# Altium footprint library 6-Connectors-4.PcbLib: 166 footprints (part 9 of 12) (continued)
## SAMTEC_SQT-112-01-L-D-RA [mm] "24 Contacts - Pitch 2mm - Dual Row Right Angle Socket" (continued)
  text "1" at 12.3,-1.4 h1.02
  text "24" at -13.7,0.5 h1
3D body "SAMTEC_SQT-112-01-L-D-RA.stp": height 4, standoff -2.29, extent -12.15,-1.25 12.15,8.62
3D body "v160-080.stp": height 0.02, standoff -1.65, extent -11.8,0.2 -10.2,1.8
3D body "v160-080.stp": height 0.02, standoff -1.65, extent -11.8,-1.8 -10.2,-0.2
3D body "v160-080.stp": height 0.02, standoff -1.65, extent -7.8,0.2 -6.2,1.8
3D body "v160-080.stp": height 0.02, standoff -1.65, extent -7.8,-1.8 -6.2,-0.2
3D body "v160-080.stp": height 0.02, standoff -1.65, extent -9.8,-1.8 -8.2,-0.2
3D body "v160-080.stp": height 0.02, standoff -1.65, extent -9.8,0.2 -8.2,1.8
3D body "v160-080.stp": height 0.02, standoff -1.65, extent -5.8,-1.8 -4.2,-0.2
3D body "v160-080.stp": height 0.02, standoff -1.65, extent -5.8,0.2 -4.2,1.8
3D body "v160-080.stp": height 0.02, standoff -1.65, extent -3.8,0.2 -2.2,1.8
3D body "v160-080.stp": height 0.02, standoff -1.65, extent -3.8,-1.8 -2.2,-0.2
3D body "v160-080.stp": height 0.02, standoff -1.65, extent -1.8,0.2 -0.2,1.8
3D body "v160-080.stp": height 0.02, standoff -1.65, extent -1.8,-1.8 -0.2,-0.2
3D body "v160-080.stp": height 0.02, standoff -1.65, extent 0.2,0.2 1.8,1.8
3D body "v160-080.stp": height 0.02, standoff -1.65, extent 0.2,-1.8 1.8,-0.2
3D body "v160-080.stp": height 0.02, standoff -1.65, extent 2.2,-1.8 3.8,-0.2
3D body "v160-080.stp": height 0.02, standoff -1.65, extent 2.2,0.2 3.8,1.8
3D body "v160-080.stp": height 0.02, standoff -1.65, extent 4.2,-1.8 5.8,-0.2
3D body "v160-080.stp": height 0.02, standoff -1.65, extent 4.2,0.2 5.8,1.8
3D body "v160-080.stp": height 0.02, standoff -1.65, extent 6.2,0.2 7.8,1.8
3D body "v160-080.stp": height 0.02, standoff -1.65, extent 6.2,-1.8 7.8,-0.2
3D body "v160-080.stp": height 0.02, standoff -1.65, extent 8.2,-1.8 9.8,-0.2
3D body "v160-080.stp": height 0.02, standoff -1.65, extent 10.2,-1.8 11.8,-0.2
3D body "v160-080.stp": height 0.02, standoff -1.65, extent 8.2,0.2 9.8,1.8
3D body "v160-080.stp": height 0.02, standoff -1.65, extent 10.2,0.2 11.8,1.8

## SAMTEC_SQT-113-01-L-D-RA [mm] "26 Contacts - Pitch 2mm - Dual Row Right Angle Socket"
height 4
pads (26):
  round 1.4 hole 0.9: 1(12,-1) 2(12,1) 3(10,-1) 4(10,1) 5(8,-1) 6(8,1) 7(6,-1) 8(6,1) 9(4,-1) 10(4,1) 11(2,-1) 12(2,1) 13(0,-1) 14(0,1) 15(-2,-1) 16(-2,1) 17(-4,-1) 18(-4,1) 19(-6,-1) 20(-6,1) 21(-8,-1) 22(-8,1) 23(-10,-1) 24(-10,1) 25(-12,-1) 26(-12,1)
Top Overlay:
  circle w0.3: c12.027,-2.378 r0.15
  lines w0.2: -12.25,2 -12.25,2.651 ; -11.75,2 -11.75,2.651 ; -10.25,2 -10.25,2.651 ; -9.75,2 -9.75,2.651 ; -8.25,2 -8.25,2.651 ; -7.75,2 -7.75,2.651 ; -6.25,2 -6.25,2.651 ; -5.75,2 -5.75,2.651 ; -4.25,2 -4.25,2.651 ; -3.75,2 -3.75,2.651 ; -2.25,2 -2.25,2.651 ; -1.75,2 -1.75,2.651 ; -0.25,2 -0.25,2.651 ; 0.25,2 0.25,2.651 ; 1.75,2 1.75,2.651 ; 2.25,2 2.25,2.651 ; 3.75,2 3.75,2.651 ; 4.25,2 4.25,2.651 ; 5.75,2 5.75,2.651 ; 6.25,2 6.25,2.651 ; 7.75,2 7.75,2.651 ; 8.25,2 8.25,2.651 ; 9.75,2 9.75,2.651 ; 10.25,2 10.25,2.651 ; 11.75,2 11.75,2.651 ; 12.25,2 12.25,2.651 ; -13.15,2.27 -12.492,2.27 -12.492,2.651 -11.508,2.651 -11.508,2.27 -10.492,2.27 -10.492,2.651 -9.508,2.651 -9.508,2.27 -8.492,2.27 -8.492,2.651 -7.508,2.651 -7.508,2.27 -6.492,2.27 -6.492,2.651 -5.508,2.651 -5.508,2.27 -4.492,2.27 -4.492,2.651 -3.508,2.651 -3.508,2.27 -2.492,2.27 -2.492,2.651 -1.508,2.651 -1.508,2.27 -0.492,2.27 -0.492,2.651 0.492,2.651 0.492,2.27 1.508,2.27 1.508,2.651 2.492,2.651 2.492,2.27 3.508,2.27 3.508,2.651 4.492,2.651 4.492,2.27 5.508,2.27 5.508,2.651 6.492,2.651 6.492,2.27 7.508,2.27 7.508,2.651 8.492,2.651 8.492,2.27 9.508,2.27 9.508,2.651 10.492,2.651 10.492,2.27 11.508,2.27 11.508,2.651 12.492,2.651 12.492,2.27 13.15,2.27 13.15,8.62 -13.15,8.62 -13.15,2.27
  text "1" at 13.3,-1.4 h1.02
  text "26" at -14.7,0.5 h1
Mechanical 8:
  lines w0.1: -12.5,-1 -12,-1 ; -12.5,1 -12,1 ; -12,-1.5 -12,-1 ; -12,-0.5 -12,-1 ; -12,0.5 -12,1 ; -12,1.5 -12,1 ; -11.5,-1 -12,-1 ; -11.5,1 -12,1 ; -10.5,-1 -10,-1 ; -10.5,1 -10,1 ; -10,-1.5 -10,-1 ; -10,-0.5 -10,-1 ; -10,0.5 -10,1 ; -10,1.5 -10,1 ; -9.5,-1 -10,-1 ; -9.5,1 -10,1 ; -8.5,-1 -8,-1 ; -8.5,1 -8,1 ; -8,-1.5 -8,-1 ; -8,-0.5 -8,-1 ; -8,0.5 -8,1 ; -8,1.5 -8,1 ; -7.5,-1 -8,-1 ; -7.5,1 -8,1 ; -6.5,-1 -6,-1 ; -6.5,1 -6,1 ; -6,-1.5 -6,-1 ; -6,-0.5 -6,-1 ; -6,0.5 -6,1 ; -6,1.5 -6,1 ; -5.5,-1 -6,-1 ; -5.5,1 -6,1 ; -4.5,-1 -4,-1 ; -4.5,1 -4,1 ; -4,-1.5 -4,-1 ; -4,-0.5 -4,-1 ; -4,0.5 -4,1 ; -4,1.5 -4,1 ; -3.5,-1 -4,-1 ; -3.5,1 -4,1 ; -2.5,-1 -2,-1 ; -2.5,1 -2,1 ; -2,-1.5 -2,-1 ; -2,-0.5 -2,-1 ; -2,0.5 -2,1 ; -2,1.5 -2,1 ; -1.5,-1 -2,-1 ; -1.5,1 -2,1 ; -0.5,-1 0,-1 ; -0.5,0 0,0 ; -0.5,1 0,1 ; 0,-1.5 0,-1 ; 0,1.5 0,1 ; 0.5,-1 0,-1 ; 0.5,0 0,0 ; 0.5,1 0,1 ; 1.5,-1 2,-1 ; 1.5,1 2,1 ; 2,-1.5 2,-1 ; 2,-0.5 2,-1 ; 2,0.5 2,1 ; 2,1.5 2,1 ; 2.5,-1 2,-1 ; 2.5,1 2,1 ; 3.5,-1 4,-1 ; 3.5,1 4,1 ; 4,-1.5 4,-1 ; 4,-0.5 4,-1 ; 4,0.5 4,1 ; 4,1.5 4,1 ; 4.5,-1 4,-1 ; 4.5,1 4,1 ; 5.5,-1 6,-1 ; 5.5,1 6,1 ; 6,-1.5 6,-1 ; 6,-0.5 6,-1 ; 6,0.5 6,1 ; 6,1.5 6,1 ; 6.5,-1 6,-1 ; 6.5,1 6,1 ; 7.5,-1 8,-1 ; 7.5,1 8,1 ; 8,-1.5 8,-1 ; 8,-0.5 8,-1 ; 8,0.5 8,1 ; 8,1.5 8,1 ; 8.5,-1 8,-1 ; 8.5,1 8,1 ; 9.5,-1 10,-1 ; 9.5,1 10,1 ; 10,-1.5 10,-1 ; 10,-0.5 10,-1 ; 10,0.5 10,1 ; 10,1.5 10,1 ; 10.5,-1 10,-1 ; 10.5,1 10,1 ; 11.5,-1 12,-1 ; 11.5,1 12,1 ; 12,-1.5 12,-1 ; 12,-0.5 12,-1 ; 12,0.5 12,1 ; 12,1.5 12,1 ; 12.5,-1 12,-1 ; 12.5,1 12,1 ; 0,-1 0,-0.5 0,0 ; 0,0 0,0.5 0,1
Mechanical 14:
  circle w0.3: c12.027,-2.378 r0.15
  lines w0.1: -12.25,2.651 -12.25,-1.218 -11.75,-1.219 -11.75,2.651 ; -10.25,2.651 -10.25,-1.22 -9.75,-1.22 -9.75,2.651 ; -8.25,2.651 -8.25,-1.221 -7.75,-1.221 -7.75,2.651 ; -6.25,2.651 -6.25,-1.222 -5.75,-1.223 -5.75,2.651 ; -4.25,2.651 -4.25,-1.224 -3.75,-1.224 -3.75,2.651 ; -2.25,2.651 -2.25,-1.225 -1.75,-1.225 -1.75,2.651 ; -0.25,2.651 -0.25,-1.226 0.25,-1.227 0.25,2.651 ; 1.75,2.651 1.75,-1.228 2.25,-1.228 2.25,2.651 ; 3.75,2.651 3.75,-1.229 4.25,-1.229 4.25,2.651 ; 5.75,2.651 5.75,-1.23 6.25,-1.23 6.25,2.651 ; 7.75,2.651 7.75,-1.231 8.25,-1.232 8.25,2.651 ; 9.75,2.651 9.75,-1.233 10.25,-1.233 10.25,2.651 ; 11.75,2.651 11.75,-1.234 12.25,-1.234 12.25,2.651 ; -13.15,2.27 -12.492,2.27 -12.492,2.651 -11.508,2.651 -11.508,2.27 -10.492,2.27 -10.492,2.651 -9.508,2.651 -9.508,2.27 -8.492,2.27 -8.492,2.651 -7.508,2.651 -7.508,2.27 -6.492,2.27 -6.492,2.651 -5.508,2.651 -5.508,2.27 -4.492,2.27 -4.492,2.651 -3.508,2.651 -3.508,2.27 -2.492,2.27 -2.492,2.651 -1.508,2.651 -1.508,2.27 -0.492,2.27 -0.492,2.651 0.492,2.651 0.492,2.27 1.508,2.27 1.508,2.651 2.492,2.651 2.492,2.27 3.508,2.27 3.508,2.651 4.492,2.651 4.492,2.27 5.508,2.27 5.508,2.651 6.492,2.651 6.492,2.27 7.508,2.27 7.508,2.651 8.492,2.651 8.492,2.27 9.508,2.27 9.508,2.651 10.492,2.651 10.492,2.27 11.508,2.27 11.508,2.651 12.492,2.651 12.492,2.27 13.15,2.27 13.15,8.62 -13.15,8.62 -13.15,2.27
  text "1" at 13.3,-1.4 h1.02
  text "26" at -14.7,0.5 h1
3D body "v160-080.stp": height 0.02, standoff -1.65, extent 11.2,-1.8 12.8,-0.2
3D body "v160-080.stp": height 0.02, standoff -1.65, extent 11.2,0.2 12.8,1.8
3D body "v160-080.stp": height 0.02, standoff -1.65, extent 9.2,0.2 10.8,1.8
3D body "v160-080.stp": height 0.02, standoff -1.65, extent 9.2,-1.8 10.8,-0.2
3D body "v160-080.stp": height 0.02, standoff -1.65, extent 7.2,-1.8 8.8,-0.2
3D body "v160-080.stp": height 0.02, standoff -1.65, extent 7.2,0.2 8.8,1.8
3D body "v160-080.stp": height 0.02, standoff -1.65, extent 5.2,0.2 6.8,1.8
3D body "v160-080.stp": height 0.02, standoff -1.65, extent 5.2,-1.8 6.8,-0.2
3D body "v160-080.stp": height 0.02, standoff -1.65, extent 3.2,0.2 4.8,1.8
3D body "v160-080.stp": height 0.02, standoff -1.65, extent 3.2,-1.8 4.8,-0.2
3D body "v160-080.stp": height 0.02, standoff -1.65, extent 1.2,0.2 2.8,1.8
3D body "v160-080.stp": height 0.02, standoff -1.65, extent 1.2,-1.8 2.8,-0.2
3D body "v160-080.stp": height 0.02, standoff -1.65, extent -0.8,-1.8 0.8,-0.2
3D body "v160-080.stp": height 0.02, standoff -1.65, extent -0.8,0.2 0.8,1.8
3D body "v160-080.stp": height 0.02, standoff -1.65, extent -2.8,0.2 -1.2,1.8
3D body "v160-080.stp": height 0.02, standoff -1.65, extent -2.8,-1.8 -1.2,-0.2
3D body "v160-080.stp": height 0.02, standoff -1.65, extent -4.8,0.2 -3.2,1.8
3D body "v160-080.stp": height 0.02, standoff -1.65, extent -4.8,-1.8 -3.2,-0.2
3D body "v160-080.stp": height 0.02, standoff -1.65, extent -6.8,-1.8 -5.2,-0.2
3D body "v160-080.stp": height 0.02, standoff -1.65, extent -6.8,0.2 -5.2,1.8
3D body "v160-080.stp": height 0.02, standoff -1.65, extent -8.8,0.2 -7.2,1.8
3D body "v160-080.stp": height 0.02, standoff -1.65, extent -8.8,-1.8 -7.2,-0.2
3D body "v160-080.stp": height 0.02, standoff -1.65, extent -10.8,0.2 -9.2,1.8
3D body "v160-080.stp": height 0.02, standoff -1.65, extent -10.8,-1.8 -9.2,-0.2
3D body "v160-080.stp": height 0.02, standoff -1.65, extent -12.8,-1.8 -11.2,-0.2
3D body "v160-080.stp": height 0.02, standoff -1.65, extent -12.8,0.2 -11.2,1.8
3D body "SAMTEC_SQT-113-01-L-D-RA.stp": height 4, standoff -2.29, extent -13.15,-1.25 13.15,8.62

## SAMTEC_SQT-125-01-L-D-RA [mm] "50 Contacts - Pitch 2mm - Dual Row Right Angle Socket"
height 4
pads (50):
  round 1.4 hole 0.9: 1(24,-1) 2(24,1) 3(22,-1) 4(22,1) 5(20,-1) 6(20,1) 7(18,-1) 8(18,1) 9(16,-1) 10(16,1) 11(14,-1) 12(14,1) 13(12,-1) 14(12,1) 15(10,-1) 16(10,1) 17(8,-1) 18(8,1) 19(6,-1) 20(6,1) 21(4,-1) 22(4,1) 23(2,-1) 24(2,1) 25(0,-1) 26(0,1) 27(-2,-1) 28(-2,1) 29(-4,-1) 30(-4,1) 31(-6,-1) 32(-6,1) 33(-8,-1) 34(-8,1) 35(-10,-1) 36(-10,1) 37(-12,-1) 38(-12,1) 39(-14,-1) 40(-14,1) 41(-16,-1) 42(-16,1) 43(-18,-1) 44(-18,1) 45(-20,-1) 46(-20,1) 47(-22,-1) 48(-22,1) 49(-24,-1) 50(-24,1)
Top Overlay:
  drawing of 155 lines, arcs and shapes, not listed
  text "50" at -26.7,0.5 h1
  text "1" at 25.3,-1.4 h1.02
Mechanical 8:
  drawing of 204 lines, arcs and shapes, not listed
Mechanical 14:
  drawing of 180 lines, arcs and shapes, not listed
  text "50" at -26.7,0.5 h1
  text "1" at 25.3,-1.4 h1.02
3D body "v160-080.stp": height 0.02, standoff -1.65, extent 23.2,0.2 24.8,1.8
3D body "v160-080.stp": height 0.02, standoff -1.65, extent 23.2,-1.8 24.8,-0.2
3D body "v160-080.stp": height 0.02, standoff -1.65, extent 21.2,0.2 22.8,1.8
3D body "v160-080.stp": height 0.02, standoff -1.65, extent 21.2,-1.8 22.8,-0.2
3D body "v160-080.stp": height 0.02, standoff -1.65, extent 19.2,0.2 20.8,1.8
3D body "v160-080.stp": height 0.02, standoff -1.65, extent 19.2,-1.8 20.8,-0.2
3D body "v160-080.stp": height 0.02, standoff -1.65, extent 17.2,0.2 18.8,1.8
3D body "v160-080.stp": height 0.02, standoff -1.65, extent 17.2,-1.8 18.8,-0.2
3D body "v160-080.stp": height 0.02, standoff -1.65, extent 15.2,0.2 16.8,1.8
3D body "v160-080.stp": height 0.02, standoff -1.65, extent 15.2,-1.8 16.8,-0.2
3D body "v160-080.stp": height 0.02, standoff -1.65, extent 13.2,0.2 14.8,1.8
3D body "v160-080.stp": height 0.02, standoff -1.65, extent 13.2,-1.8 14.8,-0.2
3D body "v160-080.stp": height 0.02, standoff -1.65, extent 11.2,0.2 12.8,1.8
3D body "v160-080.stp": height 0.02, standoff -1.65, extent 11.2,-1.8 12.8,-0.2
3D body "v160-080.stp": height 0.02, standoff -1.65, extent 9.2,0.2 10.8,1.8
3D body "v160-080.stp": height 0.02, standoff -1.65, extent 9.2,-1.8 10.8,-0.2
3D body "v160-080.stp": height 0.02, standoff -1.65, extent 7.2,0.2 8.8,1.8
3D body "v160-080.stp": height 0.02, standoff -1.65, extent 7.2,-1.8 8.8,-0.2
3D body "v160-080.stp": height 0.02, standoff -1.65, extent 5.2,0.2 6.8,1.8
3D body "v160-080.stp": height 0.02, standoff -1.65, extent 5.2,-1.8 6.8,-0.2
3D body "v160-080.stp": height 0.02, standoff -1.65, extent 3.2,0.2 4.8,1.8
3D body "v160-080.stp": height 0.02, standoff -1.65, extent 3.2,-1.8 4.8,-0.2
3D body "v160-080.stp": height 0.02, standoff -1.65, extent 1.2,0.2 2.8,1.8
3D body "v160-080.stp": height 0.02, standoff -1.65, extent 1.2,-1.8 2.8,-0.2
3D body "v160-080.stp": height 0.02, standoff -1.65, extent -0.8,0.2 0.8,1.8
3D body "v160-080.stp": height 0.02, standoff -1.65, extent -0.8,-1.8 0.8,-0.2
3D body "v160-080.stp": height 0.02, standoff -1.65, extent -2.8,0.2 -1.2,1.8
3D body "v160-080.stp": height 0.02, standoff -1.65, extent -2.8,-1.8 -1.2,-0.2
3D body "v160-080.stp": height 0.02, standoff -1.65, extent -4.8,0.2 -3.2,1.8
3D body "v160-080.stp": height 0.02, standoff -1.65, extent -4.8,-1.8 -3.2,-0.2
3D body "v160-080.stp": height 0.02, standoff -1.65, extent -6.8,0.2 -5.2,1.8
3D body "v160-080.stp": height 0.02, standoff -1.65, extent -6.8,-1.8 -5.2,-0.2
3D body "v160-080.stp": height 0.02, standoff -1.65, extent -8.8,0.2 -7.2,1.8
3D body "v160-080.stp": height 0.02, standoff -1.65, extent -8.8,-1.8 -7.2,-0.2
3D body "v160-080.stp": height 0.02, standoff -1.65, extent -10.8,0.2 -9.2,1.8
3D body "v160-080.stp": height 0.02, standoff -1.65, extent -10.8,-1.8 -9.2,-0.2
3D body "v160-080.stp": height 0.02, standoff -1.65, extent -12.8,0.2 -11.2,1.8
3D body "v160-080.stp": height 0.02, standoff -1.65, extent -12.8,-1.8 -11.2,-0.2
3D body "v160-080.stp": height 0.02, standoff -1.65, extent -14.8,0.2 -13.2,1.8
3D body "v160-080.stp": height 0.02, standoff -1.65, extent -14.8,-1.8 -13.2,-0.2
3D body "v160-080.stp": height 0.02, standoff -1.65, extent -16.8,0.2 -15.2,1.8
3D body "v160-080.stp": height 0.02, standoff -1.65, extent -16.8,-1.8 -15.2,-0.2
3D body "v160-080.stp": height 0.02, standoff -1.65, extent -18.8,0.2 -17.2,1.8
3D body "v160-080.stp": height 0.02, standoff -1.65, extent -18.8,-1.8 -17.2,-0.2
3D body "v160-080.stp": height 0.02, standoff -1.65, extent -20.8,0.2 -19.2,1.8
3D body "v160-080.stp": height 0.02, standoff -1.65, extent -20.8,-1.8 -19.2,-0.2
3D body "v160-080.stp": height 0.02, standoff -1.65, extent -22.8,0.2 -21.2,1.8
3D body "v160-080.stp": height 0.02, standoff -1.65, extent -22.8,-1.8 -21.2,-0.2
3D body "v160-080.stp": height 0.02, standoff -1.65, extent -24.8,-1.8 -23.2,-0.2
3D body "v160-080.stp": height 0.02, standoff -1.65, extent -24.8,0.2 -23.2,1.8
3D body "SAMTEC_SQT-125-01-L-D-RA.stp": height 4, standoff -2.29, extent -25.15,-1.25 25.15,8.62

## SAMTEC_SSW-102-02-G-S [mm] "2 Contacts, Pitch 2.54mm - Top Entry, Single Row, Through Mount Straigh Socket"
height 8.5
pads (2):
  round 1.7 hole 1: 1(-1.27,0) 2(1.27,0)
Top Overlay:
  circle w0.3: c-1.305,1.665 r0.15
  lines w0.2: -2.794,-1.206 -2.794,1.206 2.794,1.206 2.794,-1.206 -2.794,-1.206
Mechanical 8:
  lines w0.1: -1.77,0 -1.27,0 ; -1.27,-0.5 -1.27,0 ; -1.27,0.5 -1.27,0 ; -0.77,0 -1.27,0 ; -0.5,0 0,0 ; 0,-0.5 0,0 ; 0,0.5 0,0 ; 0.5,0 0,0 ; 0.77,0 1.27,0 ; 1.27,-0.5 1.27,0 ; 1.27,0.5 1.27,0 ; 1.77,0 1.27,0
Mechanical 14:
  circle w0.3: c-1.305,1.665 r0.15
  lines w0.1: -2.095,-0.826 -1.664,-0.394 ; -2.095,-0.826 -2.095,0.826 ; -2.095,-0.826 -0.445,-0.826 ; -2.095,0.826 -1.664,0.394 ; -2.095,0.826 -0.445,0.826 ; -1.664,-0.394 -1.664,0.394 ; -1.664,-0.394 -0.876,-0.394 ; -1.664,0.394 -0.876,0.394 ; -0.876,-0.394 -0.445,-0.826 ; -0.876,-0.394 -0.876,0.394 ; -0.876,0.394 -0.445,0.826 ; -0.445,-0.826 -0.445,0.826 ; 0.445,-0.826 0.876,-0.394 ; 0.445,-0.826 0.445,0.826 ; 0.445,-0.826 2.095,-0.826 ; 0.445,0.826 0.876,0.394 ; 0.445,0.826 2.095,0.826 ; 0.876,-0.394 0.876,0.394 ; 0.876,-0.394 1.664,-0.394 ; 0.876,0.394 1.664,0.394 ; 1.664,-0.394 2.095,-0.826 ; 1.664,-0.394 1.664,0.394 ; 1.664,0.394 2.095,0.826 ; 2.095,-0.826 2.095,0.826 ; -2.794,-1.206 -2.794,1.206 2.794,1.206 2.794,-1.206 -2.794,-1.206
3D body "SAMTEC_SSW-102-02-G-S.stp": height 8.51, standoff -4.93, extent -2.794,-1.206 2.794,1.207

## SAMTEC_SSW-104-02-L-S [mm] "4 Contacts, Pitch 2.54mm - Top Entry, Single Row, Through Mount Straigh Socket"
height 8.5
pads (4):
  oct 1.7x1.7 hole 1: 1(-3.81,0)
  round 1.7 hole 1: 2(-1.27,0) 3(1.27,0) 4(3.81,0)
Top Overlay:
  circle w0.3: c-3.845,1.665 r0.15
  lines w0.1: -5.334,-1.206 5.334,-1.206 5.334,1.206 -5.334,1.206 -5.334,-1.206
Mechanical 8:
  lines w0.1: -4.31,0 -3.81,0 ; -3.81,-0.5 -3.81,0 ; -3.81,0.5 -3.81,0 ; -3.31,0 -3.81,0 ; -1.77,0 -1.27,0 ; -1.27,-0.5 -1.27,0 ; -1.27,0.5 -1.27,0 ; -0.77,0 -1.27,0 ; -0.5,0 0,0 ; 0,-0.5 0,0 ; 0,0.5 0,0 ; 0.5,0 0,0 ; 0.77,0 1.27,0 ; 1.27,-0.5 1.27,0 ; 1.27,0.5 1.27,0 ; 1.77,0 1.27,0 ; 3.31,0 3.81,0 ; 3.81,-0.5 3.81,0 ; 3.81,0.5 3.81,0 ; 4.31,0 3.81,0
Mechanical 14:
  circle w0.3: c-3.845,1.665 r0.15
  lines w0.1: -4.636,-0.826 -2.985,-0.826 ; -4.636,-0.826 -4.636,0.826 ; -4.636,-0.826 -4.204,-0.394 ; -4.636,0.826 -2.985,0.826 ; -4.636,0.826 -4.204,0.394 ; -4.204,-0.394 -3.416,-0.394 ; -4.204,-0.394 -4.204,0.394 ; -4.204,0.394 -3.416,0.394 ; -3.416,-0.394 -3.416,0.394 ; -3.416,-0.394 -2.985,-0.826 ; -3.416,0.394 -2.985,0.826 ; -2.985,-0.826 -2.985,0.826 ; -2.095,-0.826 -0.445,-0.826 ; -2.095,-0.826 -2.095,0.826 ; -2.095,-0.826 -1.664,-0.394 ; -2.095,0.826 -0.445,0.826 ; -2.095,0.826 -1.664,0.394 ; -1.664,-0.394 -0.876,-0.394 ; -1.664,-0.394 -1.664,0.394 ; -1.664,0.394 -0.876,0.394 ; -0.876,-0.394 -0.876,0.394 ; -0.876,-0.394 -0.445,-0.826 ; -0.876,0.394 -0.445,0.826 ; -0.445,-0.826 -0.445,0.826 ; 0.445,-0.826 2.095,-0.826 ; 0.445,-0.826 0.445,0.826 ; 0.445,-0.826 0.876,-0.394 ; 0.445,0.826 2.095,0.826 ; 0.445,0.826 0.876,0.394 ; 0.876,-0.394 1.664,-0.394 ; 0.876,-0.394 0.876,0.394 ; 0.876,0.394 1.664,0.394 ; 1.664,-0.394 1.664,0.394 ; 1.664,-0.394 2.095,-0.826 ; 1.664,0.394 2.095,0.826 ; 2.095,-0.826 2.095,0.826 ; 2.985,-0.826 4.636,-0.826 ; 2.985,-0.826 2.985,0.826 ; 2.985,-0.826 3.416,-0.394 ; 2.985,0.826 4.636,0.826 ; 2.985,0.826 3.416,0.394 ; 3.416,-0.394 4.204,-0.394 ; 3.416,-0.394 3.416,0.394 ; 3.416,0.394 4.204,0.394 ; 4.204,-0.394 4.204,0.394 ; 4.204,-0.394 4.636,-0.826 ; 4.204,0.394 4.636,0.826 ; 4.636,-0.826 4.636,0.826 ; -5.334,-1.206 5.334,-1.206 5.334,1.206 -5.334,1.206 -5.334,-1.206
3D body "m20-254via.stp": height 0.1, standoff -1.82, extent 2.96,-0.85 4.66,0.85
3D body "m20-254via.stp": height 0.1, standoff -1.82, extent 0.42,-0.85 2.12,0.85
3D body "m20-254via.stp": height 0.1, standoff -1.82, extent -2.12,-0.85 -0.42,0.85
3D body "m20-254via.stp": height 0.1, standoff -1.82, extent -4.66,-0.85 -2.96,0.85
3D body "SAMTEC_SSW-104-02-L-S.stp": height 8.51, standoff -4.93, extent -5.334,-1.206 5.334,1.207

## SAMTEC_SSW-108-02-G-D [mm] "8 Contacts, Pitch 2.54mm - Top Entry, Dual Row, Through Mount Straigh Socket"
height 8.5
pads (16):
  round 1.7 hole 1: 1(-8.89,1.27) 2(-8.89,-1.27) 3(-6.35,1.27) 4(-6.35,-1.27) 5(-3.81,1.27) 6(-3.81,-1.27) 7(-1.27,1.27) 8(-1.27,-1.27) 9(1.27,1.27) 10(1.27,-1.27) 11(3.81,1.27) 12(3.81,-1.27) 13(6.35,1.27) 14(6.35,-1.27) 15(8.89,1.27) 16(8.89,-1.27)
Top Overlay:
  circle w0.3: c-8.925,3.135 r0.15
  lines w0.2: -10.414,-2.477 -10.414,2.477 10.414,2.477 10.414,-2.477 -10.414,-2.477
  text "16" at 10.96,-1.85 h1
  text "1" at -11.237,0.772 h1
Mechanical 8:
  lines w0.1: -9.39,-1.27 -8.89,-1.27 ; -9.39,1.27 -8.89,1.27 ; -8.89,-1.77 -8.89,-1.27 ; -8.89,-0.77 -8.89,-1.27 ; -8.89,0.77 -8.89,1.27 ; -8.89,1.77 -8.89,1.27 ; -8.39,-1.27 -8.89,-1.27 ; -8.39,1.27 -8.89,1.27 ; -6.85,-1.27 -6.35,-1.27 ; -6.85,1.27 -6.35,1.27 ; -6.35,-1.77 -6.35,-1.27 ; -6.35,-0.77 -6.35,-1.27 ; -6.35,0.77 -6.35,1.27 ; -6.35,1.77 -6.35,1.27 ; -5.85,-1.27 -6.35,-1.27 ; -5.85,1.27 -6.35,1.27 ; -4.31,-1.27 -3.81,-1.27 ; -4.31,1.27 -3.81,1.27 ; -3.81,-1.77 -3.81,-1.27 ; -3.81,-0.77 -3.81,-1.27 ; -3.81,0.77 -3.81,1.27 ; -3.81,1.77 -3.81,1.27 ; -3.31,-1.27 -3.81,-1.27 ; -3.31,1.27 -3.81,1.27 ; -1.77,-1.27 -1.27,-1.27 ; -1.77,1.27 -1.27,1.27 ; -1.27,-1.77 -1.27,-1.27 ; -1.27,-0.77 -1.27,-1.27 ; -1.27,0.77 -1.27,1.27 ; -1.27,1.77 -1.27,1.27 ; -0.77,-1.27 -1.27,-1.27 ; -0.77,1.27 -1.27,1.27 ; -0.5,0 0,0 ; 0,-0.5 0,0 ; 0,0.5 0,0 ; 0.5,0 0,0 ; 0.77,-1.27 1.27,-1.27 ; 0.77,1.27 1.27,1.27 ; 1.27,-1.77 1.27,-1.27 ; 1.27,-0.77 1.27,-1.27 ; 1.27,0.77 1.27,1.27 ; 1.27,1.77 1.27,1.27 ; 1.77,-1.27 1.27,-1.27 ; 1.77,1.27 1.27,1.27 ; 3.31,-1.27 3.81,-1.27 ; 3.31,1.27 3.81,1.27 ; 3.81,-1.77 3.81,-1.27 ; 3.81,-0.77 3.81,-1.27 ; 3.81,0.77 3.81,1.27 ; 3.81,1.77 3.81,1.27 ; 4.31,-1.27 3.81,-1.27 ; 4.31,1.27 3.81,1.27 ; 5.85,-1.27 6.35,-1.27 ; 5.85,1.27 6.35,1.27 ; 6.35,-1.77 6.35,-1.27 ; 6.35,-0.77 6.35,-1.27 ; 6.35,0.77 6.35,1.27 ; 6.35,1.77 6.35,1.27 ; 6.85,-1.27 6.35,-1.27 ; 6.85,1.27 6.35,1.27 ; 8.39,-1.27 8.89,-1.27 ; 8.39,1.27 8.89,1.27 ; 8.89,-1.77 8.89,-1.27 ; 8.89,-0.77 8.89,-1.27 ; 8.89,0.77 8.89,1.27 ; 8.89,1.77 8.89,1.27 ; 9.39,-1.27 8.89,-1.27 ; 9.39,1.27 8.89,1.27
Mechanical 14:
  drawing of 197 lines, arcs and shapes, not listed
  text "16" at 10.96,-1.85 h1
  text "1" at -11.237,0.772 h1
3D body "SAMTEC_SSW-108-02-G-D.stp": height 8.51, standoff -4.93, extent -10.414,-2.476 10.414,2.477

## SAMTEC_SSW-132-01-L-T [mm] "96 Contacts - Pitch 2.54mm - Triple Row Through Mount Straigh Socket (Lead Length 2.64mm)"
height 8.51
pads (96):
  round 1.7 hole 1: 1(-39.37,2.54) 2(-39.37,0) 3(-39.37,-2.54) 4(-36.83,2.54) 5(-36.83,0) 6(-36.83,-2.54) 7(-34.29,2.54) 8(-34.29,0) 9(-34.29,-2.54) 10(-31.75,2.54) 11(-31.75,0) 12(-31.75,-2.54) 13(-29.21,2.54) 14(-29.21,0) 15(-29.21,-2.54) 16(-26.67,2.54) 17(-26.67,0) 18(-26.67,-2.54) 19(-24.13,2.54) 20(-24.13,0) 21(-24.13,-2.54) 22(-21.59,2.54) 23(-21.59,0) 24(-21.59,-2.54) 25(-19.05,2.54) 26(-19.05,0) 27(-19.05,-2.54) 28(-16.51,2.54) 29(-16.51,0) 30(-16.51,-2.54) 31(-13.97,2.54) 32(-13.97,0) 33(-13.97,-2.54) 34(-11.43,2.54) 35(-11.43,0) 36(-11.43,-2.54) 37(-8.89,2.54) 38(-8.89,0) 39(-8.89,-2.54) 40(-6.35,2.54) 41(-6.35,0) 42(-6.35,-2.54) 43(-3.81,2.54) 44(-3.81,0) 45(-3.81,-2.54) 46(-1.27,2.54) 47(-1.27,0) 48(-1.27,-2.54) 49(1.27,2.54) 50(1.27,0) 51(1.27,-2.54) 52(3.81,2.54) 53(3.81,0) 54(3.81,-2.54) 55(6.35,2.54) 56(6.35,0) 57(6.35,-2.54) 58(8.89,2.54) 59(8.89,0) 60(8.89,-2.54) 61(11.43,2.54) 62(11.43,0) 63(11.43,-2.54) 64(13.97,2.54) 65(13.97,0) 66(13.97,-2.54) 67(16.51,2.54) 68(16.51,0) 69(16.51,-2.54) 70(19.05,2.54) 71(19.05,0) 72(19.05,-2.54) 73(21.59,2.54) 74(21.59,0) 75(21.59,-2.54) 76(24.13,2.54) 77(24.13,0) 78(24.13,-2.54) 79(26.67,2.54) 80(26.67,0) 81(26.67,-2.54) 82(29.21,2.54) 83(29.21,0) 84(29.21,-2.54) 85(31.75,2.54) 86(31.75,0) 87(31.75,-2.54) 88(34.29,2.54) 89(34.29,0) 90(34.29,-2.54) 91(36.83,2.54) 92(36.83,0) 93(36.83,-2.54) 94(39.37,2.54) 95(39.37,0) 96(39.37,-2.54)
Top Overlay:
  circle w0.3: c-39.405,4.405 r0.15
  lines w0.2: -40.894,-3.747 -40.894,3.747 40.894,3.747 40.894,-3.747 -40.894,-3.747
  text "94" at 41.34,1.96 h1
  text "95" at 41.34,-0.58 h1
  text "3" at -42.017,-3.038 h1
  text "2" at -42.017,-0.498 h1
  text "96" at 41.34,-3.12 h1
  text "1" at -41.717,2.042 h1
Mechanical 8:
  drawing of 388 lines, arcs and shapes, not listed
Mechanical 14:
  drawing of 1157 lines, arcs and shapes, not listed
  text "94" at 41.34,1.96 h1
  text "95" at 41.34,-0.58 h1
  text "3" at -42.017,-3.038 h1
  text "2" at -42.017,-0.498 h1
  text "96" at 41.34,-3.12 h1
  text "1" at -41.717,2.042 h1
3D body "SAMTEC_SSW-132-01-L-T.stp": height 8.51, standoff -2.54, extent -40.894,-3.746 40.894,3.747

## SAMTEC_SSW-150-01-L-D [mm] "100 Contacts - Pitch 2.54mm - Double Row Through Mount Straight Header"
height 8.51
pads (100):
  round 1.7 hole 1: 1(-62.23,1.27) 2(-62.23,-1.27) 3(-59.69,1.27) 4(-59.69,-1.27) 5(-57.15,1.27) 6(-57.15,-1.27) 7(-54.61,1.27) 8(-54.61,-1.27) 9(-52.07,1.27) 10(-52.07,-1.27) 11(-49.53,1.27) 12(-49.53,-1.27) 13(-46.99,1.27) 14(-46.99,-1.27) 15(-44.45,1.27) 16(-44.45,-1.27) 17(-41.91,1.27) 18(-41.91,-1.27) 19(-39.37,1.27) 20(-39.37,-1.27) 21(-36.83,1.27) 22(-36.83,-1.27) 23(-34.29,1.27) 24(-34.29,-1.27) 25(-31.75,1.27) 26(-31.75,-1.27) 27(-29.21,1.27) 28(-29.21,-1.27) 29(-26.67,1.27) 30(-26.67,-1.27) 31(-24.13,1.27) 32(-24.13,-1.27) 33(-21.59,1.27) 34(-21.59,-1.27) 35(-19.05,1.27) 36(-19.05,-1.27) 37(-16.51,1.27) 38(-16.51,-1.27) 39(-13.97,1.27) 40(-13.97,-1.27) 41(-11.43,1.27) 42(-11.43,-1.27) 43(-8.89,1.27) 44(-8.89,-1.27) 45(-6.35,1.27) 46(-6.35,-1.27) 47(-3.81,1.27) 48(-3.81,-1.27) 49(-1.27,1.27) 50(-1.27,-1.27) 51(1.27,1.27) 52(1.27,-1.27) 53(3.81,1.27) 54(3.81,-1.27) 55(6.35,1.27) 56(6.35,-1.27) 57(8.89,1.27) 58(8.89,-1.27) 59(11.43,1.27) 60(11.43,-1.27) 61(13.97,1.27) 62(13.97,-1.27) 63(16.51,1.27) 64(16.51,-1.27) 65(19.05,1.27) 66(19.05,-1.27) 67(21.59,1.27) 68(21.59,-1.27) 69(24.13,1.27) 70(24.13,-1.27) 71(26.67,1.27) 72(26.67,-1.27) 73(29.21,1.27) 74(29.21,-1.27) 75(31.75,1.27) 76(31.75,-1.27) 77(34.29,1.27) 78(34.29,-1.27) 79(36.83,1.27) 80(36.83,-1.27) 81(39.37,1.27) 82(39.37,-1.27) 83(41.91,1.27) 84(41.91,-1.27) 85(44.45,1.27) 86(44.45,-1.27) 87(46.99,1.27) 88(46.99,-1.27) 89(49.53,1.27) 90(49.53,-1.27) 91(52.07,1.27) 92(52.07,-1.27) 93(54.61,1.27) 94(54.61,-1.27) 95(57.15,1.27) 96(57.15,-1.27) 97(59.69,1.27) 98(59.69,-1.27) 99(62.23,1.27) 100(62.23,-1.27)
Top Overlay:
  circle w0.3: c-62.265,3.135 r0.15
  lines w0.2: -63.754,-2.477 63.754,-2.477 63.754,2.477 -63.754,2.477 -63.754,-2.477
  text "1" at -64.577,0.772 h1
  text "100" at 64.3,-1.85 h1
  text "99" at 64.3,0.69 h1
  text "50" at -2.04,-3.84 h1
  text "2" at -64.827,-1.768 h1
Mechanical 8:
  drawing of 404 lines, arcs and shapes, not listed
Mechanical 14:
  drawing of 1205 lines, arcs and shapes, not listed
  text "1" at -64.577,0.772 h1
  text "100" at 64.3,-1.85 h1
  text "99" at 64.3,0.69 h1
  text "50" at -2.04,-3.84 h1
  text "2" at -64.827,-1.768 h1
3D body "SAMTEC_SSW-150-01-L-D.stp": height 8.51, standoff -2.64, extent -63.754,-2.476 63.754,2.477